# Altium footprint library mastermind.PCBLIB: 1061 footprints (part 47 of 67)
Each footprint in its own frame and in the unit in brackets; x right, y up, seen from the top. Pads: shape width x height; smd on the part's side, far side on the other; paste and mask are expansions set on the pad; w line width, h text height; cw(c..) or ccw(c..) is an arc to the next point about the centre after c.
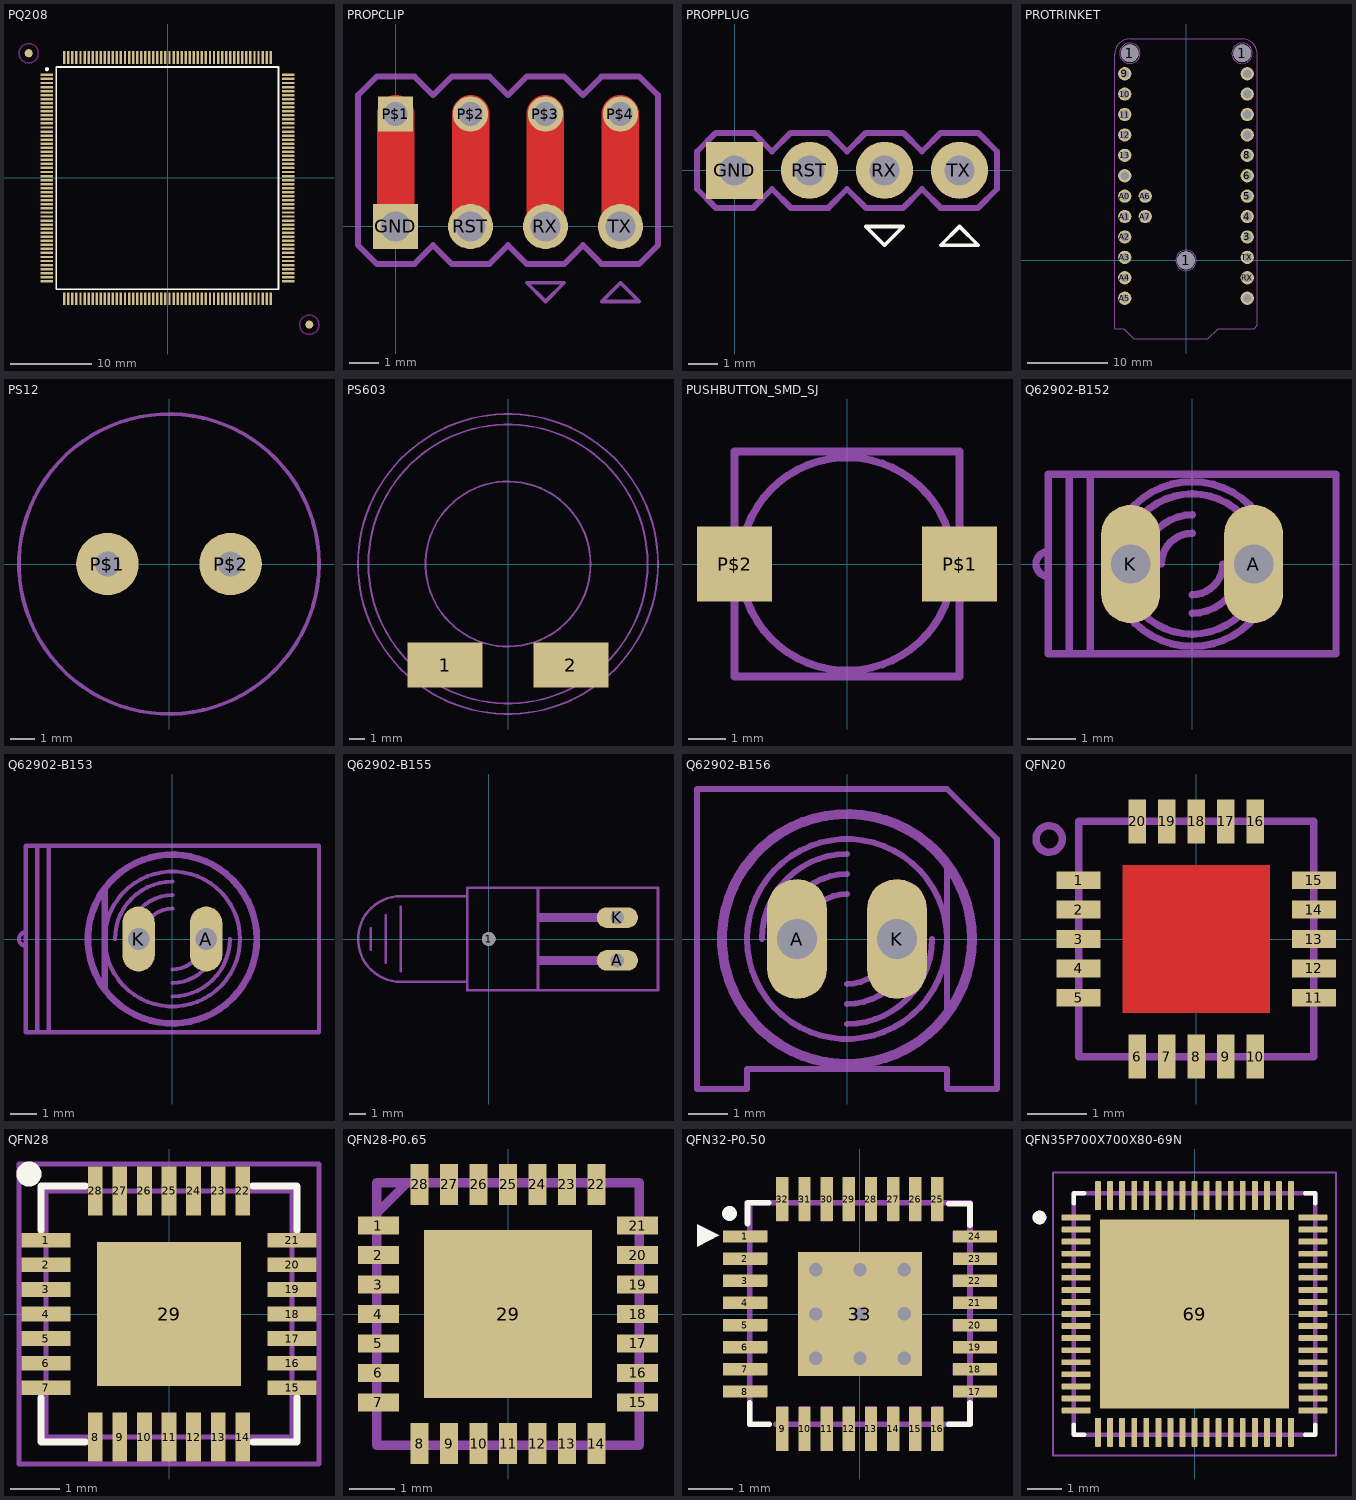
[diagram p46: the footprints below, top view; thin cyan lines are the x and y axes]

## PQ208 [mm]
pads (210):
  rect 1.55x0.3 smd: 1(-14.902,12.738) 2(-14.902,12.238) 3(-14.902,11.738) 4(-14.902,11.238) 5(-14.902,10.738) 6(-14.902,10.238) 7(-14.902,9.738) 8(-14.902,9.238) 9(-14.902,8.738) 10(-14.902,8.238) 11(-14.902,7.738) 12(-14.902,7.238) 13(-14.902,6.738) 14(-14.902,6.238) 15(-14.902,5.738) 16(-14.902,5.238) 17(-14.902,4.738) 18(-14.902,4.238) 19(-14.902,3.738) 20(-14.902,3.238) 21(-14.902,2.738) 22(-14.902,2.238) 23(-14.902,1.738) 24(-14.902,1.238) 25(-14.902,0.738) 26(-14.902,0.238) 27(-14.902,-0.262) 28(-14.902,-0.762) 29(-14.902,-1.262) 30(-14.902,-1.762) 31(-14.902,-2.262) 32(-14.902,-2.762) 33(-14.902,-3.262) 34(-14.902,-3.762) 35(-14.902,-4.262) 36(-14.902,-4.762) 37(-14.902,-5.262) 38(-14.902,-5.762) 39(-14.902,-6.262) 40(-14.902,-6.762) 41(-14.902,-7.262) 42(-14.902,-7.762) 43(-14.902,-8.262) 44(-14.902,-8.762) 45(-14.902,-9.262) 46(-14.902,-9.762) 47(-14.902,-10.262) 48(-14.902,-10.762) 49(-14.902,-11.262) 50(-14.902,-11.762) 51(-14.902,-12.262) 52(-14.902,-12.762) 105(14.898,-12.762) 106(14.898,-12.262) 107(14.898,-11.762) 108(14.898,-11.262) 109(14.898,-10.762) 110(14.898,-10.262) 111(14.898,-9.762) 112(14.898,-9.262) 113(14.898,-8.762) 114(14.898,-8.262) 115(14.898,-7.762) 116(14.898,-7.262) 117(14.898,-6.762) 118(14.898,-6.262) 119(14.898,-5.762) 120(14.898,-5.262) 121(14.898,-4.762) 122(14.898,-4.262) 123(14.898,-3.762) 124(14.898,-3.262) 125(14.898,-2.762) 126(14.898,-2.262) 127(14.898,-1.762) 128(14.898,-1.262) 129(14.898,-0.762) 130(14.898,-0.262) 131(14.898,0.238) 132(14.898,0.738) 133(14.898,1.238) 134(14.898,1.738) 135(14.898,2.238) 136(14.898,2.738) 137(14.898,3.238) 138(14.898,3.738) 139(14.898,4.238) 140(14.898,4.738) 141(14.898,5.238) 142(14.898,5.738) 143(14.898,6.238) 144(14.898,6.738) 145(14.898,7.238) 146(14.898,7.738) 147(14.898,8.238) 148(14.898,8.738) 149(14.898,9.238) 150(14.898,9.738) 151(14.898,10.238) 152(14.898,10.738) 153(14.898,11.238) 154(14.898,11.738) 155(14.898,12.238) 156(14.898,12.738)
  rect 0.3x1.55 smd: 53(-12.752,-14.912) 54(-12.252,-14.912) 55(-11.752,-14.912) 56(-11.252,-14.912) 57(-10.752,-14.912) 58(-10.252,-14.912) 59(-9.752,-14.912) 60(-9.252,-14.912) 61(-8.752,-14.912) 62(-8.252,-14.912) 63(-7.752,-14.912) 64(-7.252,-14.912) 65(-6.752,-14.912) 66(-6.252,-14.912) 67(-5.752,-14.912) 68(-5.252,-14.912) 69(-4.752,-14.912) 70(-4.252,-14.912) 71(-3.752,-14.912) 72(-3.252,-14.912) 73(-2.752,-14.912) 74(-2.252,-14.912) 75(-1.752,-14.912) 76(-1.252,-14.912) 77(-0.752,-14.912) 78(-0.252,-14.912) 79(0.248,-14.912) 80(0.748,-14.912) 81(1.248,-14.912) 82(1.748,-14.912) 83(2.248,-14.912) 84(2.748,-14.912) 85(3.248,-14.912) 86(3.748,-14.912) 87(4.248,-14.912) 88(4.748,-14.912) 89(5.248,-14.912) 90(5.748,-14.912) 91(6.248,-14.912) 92(6.748,-14.912) 93(7.248,-14.912) 94(7.748,-14.912) 95(8.248,-14.912) 96(8.748,-14.912) 97(9.248,-14.912) 98(9.748,-14.912) 99(10.248,-14.912) 100(10.748,-14.912) 101(11.248,-14.912) 102(11.748,-14.912) 103(12.248,-14.912) 104(12.748,-14.912) 157(12.748,14.888) 158(12.248,14.888) 159(11.748,14.888) 160(11.248,14.888) 161(10.748,14.888) 162(10.248,14.888) 163(9.748,14.888) 164(9.248,14.888) 165(8.748,14.888) 166(8.248,14.888) 167(7.748,14.888) 168(7.248,14.888) 169(6.748,14.888) 170(6.248,14.888) 171(5.748,14.888) 172(5.248,14.888) 173(4.748,14.888) 174(4.248,14.888) 175(3.748,14.888) 176(3.248,14.888) 177(2.748,14.888) 178(2.248,14.888) 179(1.748,14.888) 180(1.248,14.888) 181(0.748,14.888) 182(0.248,14.888) 183(-0.252,14.888) 184(-0.752,14.888) 185(-1.252,14.888) 186(-1.752,14.888) 187(-2.252,14.888) 188(-2.752,14.888) 189(-3.252,14.888) 190(-3.752,14.888) 191(-4.252,14.888) 192(-4.752,14.888) 193(-5.252,14.888) 194(-5.752,14.888) 195(-6.252,14.888) 196(-6.752,14.888) 197(-7.252,14.888) 198(-7.752,14.888) 199(-8.252,14.888) 200(-8.752,14.888) 201(-9.252,14.888) 202(-9.752,14.888) 203(-10.252,14.888) 204(-10.752,14.888) 205(-11.252,14.888) 206(-11.752,14.888) 207(-12.252,14.888) 208(-12.752,14.888)
  round 1 smd: FID1(-17.152,15.413) FID2(17.523,-18.112)
Top Layer keep-out:
  circle w0.2: c17.523,-18.137 r1.2
  circle w0.2: c-17.152,15.413 r1.2
Top Overlay:
  circle w0.25: c-14.902,13.438 r0.125
  lines w0.2: -13.727,-13.737 13.723,-13.737 13.723,13.713 -13.727,13.713 -13.727,-13.737
3D body: height 2.5, standoff 0, extent -13.716,-13.716 13.716,13.716
3D body: height 1, standoff 0, extent -15.35,12.62 -13.65,12.85
3D body: height 1, standoff 0, extent -15.35,12.12 -13.65,12.35
3D body: height 1, standoff 0, extent -15.35,11.62 -13.65,11.85
3D body: height 1, standoff 0, extent -15.35,11.12 -13.65,11.35
3D body: height 1, standoff 0, extent -15.35,10.62 -13.65,10.85
3D body: height 1, standoff 0, extent -15.35,10.12 -13.65,10.35
3D body: height 1, standoff 0, extent -15.35,9.62 -13.65,9.85
3D body: height 1, standoff 0, extent -15.35,9.12 -13.65,9.35
3D body: height 1, standoff 0, extent -15.35,8.62 -13.65,8.85
3D body: height 1, standoff 0, extent -15.35,8.12 -13.65,8.35
3D body: height 1, standoff 0, extent -15.35,7.62 -13.65,7.85
3D body: height 1, standoff 0, extent -15.35,7.12 -13.65,7.35
3D body: height 1, standoff 0, extent -15.35,6.62 -13.65,6.85
3D body: height 1, standoff 0, extent -15.35,6.12 -13.65,6.35
3D body: height 1, standoff 0, extent -15.35,5.62 -13.65,5.85
3D body: height 1, standoff 0, extent -15.35,5.12 -13.65,5.35
3D body: height 1, standoff 0, extent -15.35,4.62 -13.65,4.85
3D body: height 1, standoff 0, extent -15.35,4.12 -13.65,4.35
3D body: height 1, standoff 0, extent -15.35,3.62 -13.65,3.85
3D body: height 1, standoff 0, extent -15.35,3.12 -13.65,3.35
3D body: height 1, standoff 0, extent -15.35,2.62 -13.65,2.85
3D body: height 1, standoff 0, extent -15.35,2.12 -13.65,2.35
3D body: height 1, standoff 0, extent -15.35,1.62 -13.65,1.85
3D body: height 1, standoff 0, extent -15.35,1.12 -13.65,1.35
3D body: height 1, standoff 0, extent -15.35,0.62 -13.65,0.85
3D body: height 1, standoff 0, extent -15.35,0.12 -13.65,0.35
3D body: height 1, standoff 0, extent -15.35,-0.38 -13.65,-0.15
3D body: height 1, standoff 0, extent -15.35,-0.88 -13.65,-0.65
3D body: height 1, standoff 0, extent -15.35,-1.38 -13.65,-1.15
3D body: height 1, standoff 0, extent -15.35,-1.88 -13.65,-1.65
3D body: height 1, standoff 0, extent -15.35,-2.38 -13.65,-2.15
3D body: height 1, standoff 0, extent -15.35,-2.88 -13.65,-2.65
3D body: height 1, standoff 0, extent -15.35,-3.38 -13.65,-3.15
3D body: height 1, standoff 0, extent -15.35,-3.88 -13.65,-3.65
3D body: height 1, standoff 0, extent -15.35,-4.38 -13.65,-4.15
3D body: height 1, standoff 0, extent -15.35,-4.88 -13.65,-4.65
3D body: height 1, standoff 0, extent -15.35,-5.38 -13.65,-5.15
3D body: height 1, standoff 0, extent -15.35,-5.88 -13.65,-5.65
3D body: height 1, standoff 0, extent -15.35,-6.38 -13.65,-6.15
3D body: height 1, standoff 0, extent -15.35,-6.88 -13.65,-6.65
3D body: height 1, standoff 0, extent -15.35,-7.38 -13.65,-7.15
3D body: height 1, standoff 0, extent -15.35,-7.88 -13.65,-7.65
3D body: height 1, standoff 0, extent -15.35,-8.38 -13.65,-8.15
3D body: height 1, standoff 0, extent -15.35,-8.88 -13.65,-8.65
3D body: height 1, standoff 0, extent -15.35,-9.38 -13.65,-9.15
3D body: height 1, standoff 0, extent -15.35,-9.88 -13.65,-9.65
3D body: height 1, standoff 0, extent -15.35,-10.38 -13.65,-10.15
3D body: height 1, standoff 0, extent -15.35,-10.88 -13.65,-10.65
3D body: height 1, standoff 0, extent -15.35,-11.38 -13.65,-11.15
3D body: height 1, standoff 0, extent -15.35,-11.88 -13.65,-11.65
3D body: height 1, standoff 0, extent -15.35,-12.38 -13.65,-12.15
3D body: height 1, standoff 0, extent -15.35,-12.88 -13.65,-12.65
3D body: height 1, standoff 0, extent 13.646,-12.874 15.346,-12.644
3D body: height 1, standoff 0, extent 13.646,-12.374 15.346,-12.144
3D body: height 1, standoff 0, extent 13.646,-11.874 15.346,-11.644
3D body: height 1, standoff 0, extent 13.646,-11.374 15.346,-11.144
3D body: height 1, standoff 0, extent 13.646,-10.874 15.346,-10.644
3D body: height 1, standoff 0, extent 13.646,-10.374 15.346,-10.144
3D body: height 1, standoff 0, extent 13.646,-9.874 15.346,-9.644
3D body: height 1, standoff 0, extent 13.646,-9.374 15.346,-9.144
3D body: height 1, standoff 0, extent 13.646,-8.874 15.346,-8.644
3D body: height 1, standoff 0, extent 13.646,-8.374 15.346,-8.144
3D body: height 1, standoff 0, extent 13.646,-7.874 15.346,-7.644
3D body: height 1, standoff 0, extent 13.646,-7.374 15.346,-7.144
3D body: height 1, standoff 0, extent 13.646,-6.874 15.346,-6.644
3D body: height 1, standoff 0, extent 13.646,-6.374 15.346,-6.144
3D body: height 1, standoff 0, extent 13.646,-5.874 15.346,-5.644
3D body: height 1, standoff 0, extent 13.646,-5.374 15.346,-5.144
3D body: height 1, standoff 0, extent 13.646,-4.874 15.346,-4.644
3D body: height 1, standoff 0, extent 13.646,-4.374 15.346,-4.144
3D body: height 1, standoff 0, extent 13.646,-3.874 15.346,-3.644
3D body: height 1, standoff 0, extent 13.646,-3.374 15.346,-3.144
3D body: height 1, standoff 0, extent 13.646,-2.874 15.346,-2.644
3D body: height 1, standoff 0, extent 13.646,-2.374 15.346,-2.144
3D body: height 1, standoff 0, extent 13.646,-1.874 15.346,-1.644
3D body: height 1, standoff 0, extent 13.646,-1.374 15.346,-1.144
3D body: height 1, standoff 0, extent 13.646,-0.874 15.346,-0.644
3D body: height 1, standoff 0, extent 13.646,-0.374 15.346,-0.144
3D body: height 1, standoff 0, extent 13.646,0.126 15.346,0.356
3D body: height 1, standoff 0, extent 13.646,0.626 15.346,0.856
3D body: height 1, standoff 0, extent 13.646,1.126 15.346,1.356
3D body: height 1, standoff 0, extent 13.646,1.626 15.346,1.856
3D body: height 1, standoff 0, extent 13.646,2.126 15.346,2.356
3D body: height 1, standoff 0, extent 13.646,2.626 15.346,2.856
3D body: height 1, standoff 0, extent 13.646,3.126 15.346,3.356
3D body: height 1, standoff 0, extent 13.646,3.626 15.346,3.856
3D body: height 1, standoff 0, extent 13.646,4.126 15.346,4.356
3D body: height 1, standoff 0, extent 13.646,4.626 15.346,4.856
3D body: height 1, standoff 0, extent 13.646,5.126 15.346,5.356
3D body: height 1, standoff 0, extent 13.646,5.626 15.346,5.856
3D body: height 1, standoff 0, extent 13.646,6.126 15.346,6.356
3D body: height 1, standoff 0, extent 13.646,6.626 15.346,6.856
3D body: height 1, standoff 0, extent 13.646,7.126 15.346,7.356
3D body: height 1, standoff 0, extent 13.646,7.626 15.346,7.856
3D body: height 1, standoff 0, extent 13.646,8.126 15.346,8.356
3D body: height 1, standoff 0, extent 13.646,8.626 15.346,8.856
3D body: height 1, standoff 0, extent 13.646,9.126 15.346,9.356
3D body: height 1, standoff 0, extent 13.646,9.626 15.346,9.856
3D body: height 1, standoff 0, extent 13.646,10.126 15.346,10.356
3D body: height 1, standoff 0, extent 13.646,10.626 15.346,10.856
3D body: height 1, standoff 0, extent 13.646,11.126 15.346,11.356
3D body: height 1, standoff 0, extent 13.646,11.626 15.346,11.856
3D body: height 1, standoff 0, extent 13.646,12.126 15.346,12.356
3D body: height 1, standoff 0, extent 13.646,12.626 15.346,12.856
3D body: height 1, standoff 0, extent -12.87,13.636 -12.64,15.336
3D body: height 1, standoff 0, extent -12.37,13.636 -12.14,15.336
3D body: height 1, standoff 0, extent -11.87,13.636 -11.64,15.336
3D body: height 1, standoff 0, extent -11.37,13.636 -11.14,15.336
3D body: height 1, standoff 0, extent -10.87,13.636 -10.64,15.336
3D body: height 1, standoff 0, extent -10.37,13.636 -10.14,15.336
3D body: height 1, standoff 0, extent -9.87,13.636 -9.64,15.336
3D body: height 1, standoff 0, extent -9.37,13.636 -9.14,15.336
3D body: height 1, standoff 0, extent -8.87,13.636 -8.64,15.336
3D body: height 1, standoff 0, extent -8.37,13.636 -8.14,15.336
3D body: height 1, standoff 0, extent -7.87,13.636 -7.64,15.336
3D body: height 1, standoff 0, extent -7.37,13.636 -7.14,15.336
3D body: height 1, standoff 0, extent -6.87,13.636 -6.64,15.336
3D body: height 1, standoff 0, extent -6.37,13.636 -6.14,15.336
3D body: height 1, standoff 0, extent -5.87,13.636 -5.64,15.336
3D body: height 1, standoff 0, extent -5.37,13.636 -5.14,15.336
3D body: height 1, standoff 0, extent -4.87,13.636 -4.64,15.336
3D body: height 1, standoff 0, extent -4.37,13.636 -4.14,15.336
3D body: height 1, standoff 0, extent -3.87,13.636 -3.64,15.336
3D body: height 1, standoff 0, extent -3.37,13.636 -3.14,15.336
3D body: height 1, standoff 0, extent -2.87,13.636 -2.64,15.336
3D body: height 1, standoff 0, extent -2.37,13.636 -2.14,15.336
3D body: height 1, standoff 0, extent -1.87,13.636 -1.64,15.336
3D body: height 1, standoff 0, extent -1.37,13.636 -1.14,15.336
3D body: height 1, standoff 0, extent -0.87,13.636 -0.64,15.336
3D body: height 1, standoff 0, extent -0.37,13.636 -0.14,15.336
3D body: height 1, standoff 0, extent 0.13,13.636 0.36,15.336
3D body: height 1, standoff 0, extent 0.63,13.636 0.86,15.336
3D body: height 1, standoff 0, extent 1.13,13.636 1.36,15.336
3D body: height 1, standoff 0, extent 1.63,13.636 1.86,15.336
3D body: height 1, standoff 0, extent 2.13,13.636 2.36,15.336
3D body: height 1, standoff 0, extent 2.63,13.636 2.86,15.336
3D body: height 1, standoff 0, extent 3.13,13.636 3.36,15.336
3D body: height 1, standoff 0, extent 3.63,13.636 3.86,15.336
3D body: height 1, standoff 0, extent 4.13,13.636 4.36,15.336
3D body: height 1, standoff 0, extent 4.63,13.636 4.86,15.336
3D body: height 1, standoff 0, extent 5.13,13.636 5.36,15.336
3D body: height 1, standoff 0, extent 5.63,13.636 5.86,15.336
3D body: height 1, standoff 0, extent 6.13,13.636 6.36,15.336
3D body: height 1, standoff 0, extent 6.63,13.636 6.86,15.336
3D body: height 1, standoff 0, extent 7.13,13.636 7.36,15.336
3D body: height 1, standoff 0, extent 7.63,13.636 7.86,15.336
3D body: height 1, standoff 0, extent 8.13,13.636 8.36,15.336
3D body: height 1, standoff 0, extent 8.63,13.636 8.86,15.336
3D body: height 1, standoff 0, extent 9.13,13.636 9.36,15.336
3D body: height 1, standoff 0, extent 9.63,13.636 9.86,15.336
3D body: height 1, standoff 0, extent 10.13,13.636 10.36,15.336
3D body: height 1, standoff 0, extent 10.63,13.636 10.86,15.336
3D body: height 1, standoff 0, extent 11.13,13.636 11.36,15.336
3D body: height 1, standoff 0, extent 11.63,13.636 11.86,15.336
3D body: height 1, standoff 0, extent 12.13,13.636 12.36,15.336
3D body: height 1, standoff 0, extent 12.63,13.636 12.86,15.336
3D body: height 1, standoff 0, extent -12.864,-15.36 -12.634,-13.66
3D body: height 1, standoff 0, extent -12.364,-15.36 -12.134,-13.66
3D body: height 1, standoff 0, extent -11.864,-15.36 -11.634,-13.66
3D body: height 1, standoff 0, extent -11.364,-15.36 -11.134,-13.66
3D body: height 1, standoff 0, extent -10.864,-15.36 -10.634,-13.66
3D body: height 1, standoff 0, extent -10.364,-15.36 -10.134,-13.66
3D body: height 1, standoff 0, extent -9.864,-15.36 -9.634,-13.66
3D body: height 1, standoff 0, extent -9.364,-15.36 -9.134,-13.66
3D body: height 1, standoff 0, extent -8.864,-15.36 -8.634,-13.66
3D body: height 1, standoff 0, extent -8.364,-15.36 -8.134,-13.66
3D body: height 1, standoff 0, extent -7.864,-15.36 -7.634,-13.66
3D body: height 1, standoff 0, extent -7.364,-15.36 -7.134,-13.66
3D body: height 1, standoff 0, extent -6.864,-15.36 -6.634,-13.66
3D body: height 1, standoff 0, extent -6.364,-15.36 -6.134,-13.66
3D body: height 1, standoff 0, extent -5.864,-15.36 -5.634,-13.66
3D body: height 1, standoff 0, extent -5.364,-15.36 -5.134,-13.66
3D body: height 1, standoff 0, extent -4.864,-15.36 -4.634,-13.66
3D body: height 1, standoff 0, extent -4.364,-15.36 -4.134,-13.66
3D body: height 1, standoff 0, extent -3.864,-15.36 -3.634,-13.66
3D body: height 1, standoff 0, extent -3.364,-15.36 -3.134,-13.66
3D body: height 1, standoff 0, extent -2.864,-15.36 -2.634,-13.66
3D body: height 1, standoff 0, extent -2.364,-15.36 -2.134,-13.66
3D body: height 1, standoff 0, extent -1.864,-15.36 -1.634,-13.66
3D body: height 1, standoff 0, extent -1.364,-15.36 -1.134,-13.66
3D body: height 1, standoff 0, extent -0.864,-15.36 -0.634,-13.66
3D body: height 1, standoff 0, extent -0.364,-15.36 -0.134,-13.66
3D body: height 1, standoff 0, extent 0.136,-15.36 0.366,-13.66
3D body: height 1, standoff 0, extent 0.636,-15.36 0.866,-13.66
3D body: height 1, standoff 0, extent 1.136,-15.36 1.366,-13.66
3D body: height 1, standoff 0, extent 1.636,-15.36 1.866,-13.66
3D body: height 1, standoff 0, extent 2.136,-15.36 2.366,-13.66
3D body: height 1, standoff 0, extent 2.636,-15.36 2.866,-13.66
3D body: height 1, standoff 0, extent 3.136,-15.36 3.366,-13.66
3D body: height 1, standoff 0, extent 3.636,-15.36 3.866,-13.66
3D body: height 1, standoff 0, extent 4.136,-15.36 4.366,-13.66
3D body: height 1, standoff 0, extent 4.636,-15.36 4.866,-13.66
3D body: height 1, standoff 0, extent 5.136,-15.36 5.366,-13.66
3D body: height 1, standoff 0, extent 5.636,-15.36 5.866,-13.66
3D body: height 1, standoff 0, extent 6.136,-15.36 6.366,-13.66
3D body: height 1, standoff 0, extent 6.636,-15.36 6.866,-13.66
3D body: height 1, standoff 0, extent 7.136,-15.36 7.366,-13.66
3D body: height 1, standoff 0, extent 7.636,-15.36 7.866,-13.66
3D body: height 1, standoff 0, extent 8.136,-15.36 8.366,-13.66
3D body: height 1, standoff 0, extent 8.636,-15.36 8.866,-13.66
3D body: height 1, standoff 0, extent 9.136,-15.36 9.366,-13.66
3D body: height 1, standoff 0, extent 9.636,-15.36 9.866,-13.66
3D body: height 1, standoff 0, extent 10.136,-15.36 10.366,-13.66
3D body: height 1, standoff 0, extent 10.636,-15.36 10.866,-13.66
3D body: height 1, standoff 0, extent 11.136,-15.36 11.366,-13.66
3D body: height 1, standoff 0, extent 11.636,-15.36 11.866,-13.66
3D body: height 1, standoff 0, extent 12.136,-15.36 12.366,-13.66
3D body: height 1, standoff 0, extent 12.636,-15.36 12.866,-13.66

## PROPCLIP [mil]
pads (8):
  rect 60x60 hole 40: GND(0,0)
  rect 47.25x47.25 hole 31.5: P$1(0,150)
  round 47.25 hole 31.5: P$2(100,150) P$3(200,150) P$4(300,150)
  round 60 hole 40: RST(100,0) RX(200,0) TX(300,0)
Top Layer:
  lines w50: 0,0 0,150 ; 100,0 100,150 ; 200,0 200,150 ; 300,0 300,150
Mechanical 2:
  lines w5: 175,-75 225,-75 200,-100 175,-75 ; 275,-100 300,-75 325,-100 275,-100
  lines w8: -50,-25 -25,-50 25,-50 50,-25 75,-50 125,-50 150,-25 175,-50 225,-50 250,-25 275,-50 325,-50 350,-25 350,175 325,200 275,200 250,175 225,200 175,200 150,175 125,200 75,200 50,175 25,200 -25,200 -50,175 -50,-25
Mechanical 8:
  region: -10,-10 -10,10 10,10 10,-10
  region: 90,-10 90,10 110,10 110,-10
  region: 190,-10 190,10 210,10 210,-10
  region: 290,-10 290,10 310,10 310,-10

## PROPPLUG [mil]
pads (4):
  rect 76x76 hole 40: GND(0,0)
  round 76 hole 40: RST(100,0) RX(200,0) TX(300,0)
Top Overlay:
  lines w5: 175,-75 225,-75 200,-100 175,-75 ; 275,-100 300,-75 325,-100 275,-100
Mechanical 2:
  lines w8: -50,-25 -25,-50 25,-50 50,-25 75,-50 125,-50 150,-25 175,-50 225,-50 250,-25 275,-50 325,-50 350,-25 350,25 325,50 275,50 250,25 225,50 175,50 150,25 125,50 75,50 50,25 25,50 -25,50 -50,25 -50,-25
Mechanical 8:
  region: -10,-10 -10,10 10,10 10,-10
  region: 90,-10 90,10 110,10 110,-10
  region: 190,-10 190,10 210,10 210,-10
  region: 290,-10 290,10 310,10 310,-10

## PROTRINKET [mil]
pads (29):
  round 86.61 hole 86.61: 1(-275,1015) 1(0,0) 1(275,1015)
  round 64.97 hole 43.31: 3(300,115) 4(300,215) 5(300,315) 6(300,415) 8(300,515) 9(-300,915) 10(-300,815) 11(-300,715) 12(-300,615) 13(-300,515) A0(-300,315) A1(-300,215) A2(-300,115) A3(-300,15) A4(-300,-85) A5(-300,-185) A6(-200,315) A7(-200,215) AREF(-300,415) BAT+(300,915) GND(300,815) RST(300,-185) RX(300,-85) TX(300,15) USB(300,715) VCC(300,615)
Mechanical 2:
  lines w0: -350,-335 -305,-335 -255,-385 107.5,-385 157.5,-335 335,-335 350,-317.5 350,1010 ccw(c275,1010) 275,1085 -275,1085 ccw(c-275,1010) -350,1010 -350,-335
Mechanical 8:
  circle w5: c0,0 r50
  circle w5: c-275,1015 r50
  circle w5: c275,1015 r50.25

## PS12 [mm]
pads (2):
  round 2.54 hole 1: P$1(-2.5,0) P$2(2.5,0)
Mechanical 2:
  circle w0.152: c0,0 r6.096

## PS603 [mm]
pads (2):
  rect 5x3 smd: 1(-4.184,-6.738) 2(4.184,-6.738)
Mechanical 2:
  circle w0.127: c0,0 r5.5
  circle w0.127: c0,0 r9.302
  circle w0.127: c0,0 r10

## PUSHBUTTON_SMD_SJ [mm]
pads (2):
  rect 2x2 smd: P$1(3,0) P$2(-3,0)
Mechanical 2:
  lines w0.203: -3,-1.7 -3,-3 3,-3 3,-1.7 ; -3,1.7 -3,3 3,3 3,1.7
Mechanical 8:
  circle w0.203: c0,0 r2.84
  lines w0.127: -3,-3 3,-3 ; -3,3 3,3
  lines w0.203: -3,-3 -3,3 ; 3,-3 3,3

## Q62902-B152 [mil]
pads (2):
  oval 48x96 hole 32: A(50,0) K(-50,0)
Mechanical 2:
  lines w6: -117,-10 cw(c-117,0) -117,10 ; -57.55,34.31 cw(c0,0) 0,67 cw(c0,0) 57.77,33.93 ; -57.37,-34.62 ccw(c-0.01,0) 0,-67 ccw(c0.01,0) 57.37,-34.62 ; -45.22,34.7 cw(c0,0) 0,57 cw(c0,0) 45.18,34.75 ; -44.69,-35.38 ccw(c0,0) 0,-57 ccw(c0,0) 44.51,-35.61 ; -25,0 cw(c0,0) 0,25 ; -100,-73 -117,-73 -117,73 -100,73 ; -100,-73 -100,73 ; -100,-73 -83,-73 ; -100,73 -83,73 ; -83,-73 -83,-19 -83,19 -83,73 ; -83,-73 117,-73 117,-19 117,19 117,73 -83,73
Mechanical 8:
  lines w6: -57.09,-35.06 cw(c0,0.01) -67,0 cw(c-0.01,0) -56.88,35.41 ; -45.1,34.85 ccw(c-0.01,0) -57,0 ccw(c0,0) -44.51,-35.61 ; -40,0 cw(c0,0) 0,40 ; 0,-40 ccw(c0,0) 40,0 ; 0,-25 ccw(c0,0) 25,0 ; 44.41,-35.72 ccw(c0,0.01) 57,0 ccw(c0,0) 44.89,35.13 ; 56.93,-35.33 ccw(c0.01,-0.01) 67,0 ccw(c-0.01,0) 57.17,34.94

## Q62902-B153 [mil]
pads (2):
  oval 48x96 hole 32: A(50,0) K(-50,0)
Mechanical 2:
  circle w6: c0,0 r100
  circle w10: c0,0 r125
  lines w6: -217,-10 cw(c-217,0) -217,10 ; -200,-138 -183,-138 ; -200,-138 -200,138 ; -200,-138 -217,-138 -217,138 -200,138 ; -200,138 -183,138 ; -183,-138 217,-138 217,138 -183,138 ; -183,-138 -183,138
  lines w10: -100,-75 -100,75
Mechanical 8:
  lines w6: -85,0 cw(c0,0) 0,85 ; -65,0 cw(c0,0) 0,65 ; -45,0 cw(c0,0) 0,45 ; 0,-85 ccw(c0,0) 85,0 ; 0,-65 ccw(c0,0) 65,0 ; 0,-45 ccw(c0,0) 45,0

## Q62902-B155 [mil]
pads (3):
  round 32 hole 32: 1(0,0)
  oval 96x48 hole 32: A(300,-50) K(300,50)
Mechanical 2:
  region: 115,40 115,60 265,60 265,40
  region: 115,-60 115,-40 265,-40 265,-60
  lines w6: -275,-25 -275,25 ; -240,-55 -240,55 ; -205,-75 -205,75 ; -50,-100 -50,-120 115,-120 ; -50,-100 -205,-100 cw(c-205,0) -205,100 -50,100 ; -50,-100 -50,100 ; -50,100 -50,120 115,120 ; 115,-120 115,120 ; 115,-120 395,-120 395,120 115,120

## Q62902-B156 [mil]
pads (2):
  oval 60x120 hole 40: A(-50,0) K(50,0)
Mechanical 2:
  circle w10: c0,0 r125
  circle w6: c0,0 r100
  lines w6: 100,-75 100,75 ; -150,-150 -100,-150 -100,-130 100,-130 100,-150 150,-150 150,100 100,150 -150,150 -150,-150
Mechanical 8:
  lines w6: -85,0 cw(c0,0) 0,85 ; -65,0 cw(c0,0) 0,65 ; -45,0 cw(c0,0) 0,45 ; 0,-85 ccw(c0,0) 85,0 ; 0,-65 ccw(c0,0) 65,0 ; 0,-45 ccw(c0,0) 45,0

## QFN20 [mm]
pads (20):
  rect 0.75x0.3 smd: 1(-2,1) 2(-2,0.5) 3(-2,0) 4(-2,-0.5) 5(-2,-1) 11(2,-1) 12(2,-0.5) 13(2,0) 14(2,0.5) 15(2,1)
  rect 0.3x0.75 smd: 6(-1,-2) 7(-0.5,-2) 8(0,-2) 9(0.5,-2) 10(1,-2) 16(1,2) 17(0.5,2) 18(0,2) 19(-0.5,2) 20(-1,2)
Top Layer:
  region: -1.25,-1.25 -1.25,1.25 1.25,1.25 1.25,-1.25
Top Paste:
  region: -1.2,-1.2 -1.2,-0.4 -0.4,-0.4 -0.4,-1.2
  region: 0.4,-1.2 0.4,-0.4 1.2,-0.4 1.2,-1.2
  region: 0.4,0.4 0.4,1.2 1.2,1.2 1.2,0.4
  region: -1.2,0.4 -1.2,1.2 -0.4,1.2 -0.4,0.4
Top Solder:
  region: -1.3,-1.3 -1.3,1.3 1.3,1.3 1.3,-1.3
Mechanical 2:
  circle w0.127: c-2.5,1.7 r0.224
  lines w0.127: -2,-2 -2,2 2,2 2,-2 -2,-2

## QFN28 [mm]
pads (29):
  rect 1x0.3 smd: 1(-2.5,1.5) 2(-2.5,1) 3(-2.5,0.5) 4(-2.5,0) 5(-2.5,-0.5) 6(-2.5,-1) 7(-2.5,-1.5) 15(2.5,-1.5) 16(2.5,-1) 17(2.5,-0.5) 18(2.5,0) 19(2.5,0.5) 20(2.5,1) 21(2.5,1.5)
  rect 0.3x1 smd: 8(-1.5,-2.5) 9(-1,-2.5) 10(-0.5,-2.5) 11(0,-2.5) 12(0.5,-2.5) 13(1,-2.5) 14(1.5,-2.5) 22(1.5,2.5) 23(1,2.5) 24(0.5,2.5) 25(0,2.5) 26(-0.5,2.5) 27(-1,2.5) 28(-1.5,2.5)
  rect 2.921x2.921 smd paste-3.2: 29(0,0)
Top Overlay:
  circle w0.254: c-2.844,2.844 r0.127
  lines w0.15: -2.6,-1.7 -2.6,-2.6 -1.7,-2.6 ; -2.6,1.7 -2.6,2.6 ; -2.591,2.6 -1.7,2.6 ; 1.7,-2.6 2.6,-2.6 2.6,-1.7 ; 1.7,2.6 2.6,2.6 2.6,1.7
Top Paste:
  region: 1.524,-0.381 1.524,0.381 0.762,0.381 0.762,-0.381
  region: -0.762,-0.381 -0.762,0.381 -1.524,0.381 -1.524,-0.381
  region: 0.381,-0.381 0.381,0.381 -0.381,0.381 -0.381,-0.381
  region: 1.524,-1.524 1.524,-0.762 0.762,-0.762 0.762,-1.524
  region: 0.381,-1.524 0.381,-0.762 -0.381,-0.762 -0.381,-1.524
  region: -1.524,-1.524 -0.762,-1.524 -0.762,-0.762 -1.524,-0.762
  region: -1.524,0.762 -0.762,0.762 -0.762,1.524 -1.524,1.524
  region: -0.381,1.524 -0.381,0.762 0.381,0.762 0.381,1.524
  region: 0.762,1.524 0.762,0.762 1.524,0.762 1.524,1.524
Mechanical 13:
  lines w0.1: -2.5,-2.5 2.5,-2.5 2.5,2.5 -2.5,2.5 -2.5,-2.5
Mechanical 15:
  lines w0.1: -0.5,0 0.5,0 ; 0,-0.5 0,0.5 ; -3.048,-3.048 3.048,-3.048 3.048,3.048 -3.048,3.048 -3.048,-3.048
3D body "User Library-QFN-28-0_5.STEP": height 1, standoff 0, extent -2.5,-2.5 2.5,2.5

## QFN28-P0.65 [mm]
pads (29):
  rect 0.9x0.4 smd paste-0.35 mask-0.35: 1(-2.86,1.95) 2(-2.86,1.3) 3(-2.86,0.65) 4(-2.86,0) 5(-2.86,-0.65) 6(-2.86,-1.3) 7(-2.86,-1.95) 15(2.86,-1.95) 16(2.86,-1.3) 17(2.86,-0.65) 18(2.86,0) 19(2.86,0.65) 20(2.86,1.3) 21(2.86,1.95)
  rect 0.4x0.9 smd paste-0.35 mask-0.35: 8(-1.95,-2.86) 9(-1.3,-2.86) 10(-0.65,-2.86) 11(0,-2.86) 12(0.65,-2.86) 13(1.3,-2.86) 14(1.95,-2.86) 22(1.95,2.86) 23(1.3,2.86) 24(0.65,2.86) 25(0,2.86) 26(-0.65,2.86) 27(-1.3,2.86) 28(-1.95,2.86)
  rect 3.7x3.7 smd paste-1.85 mask-1.85: 29(0,0)
Top Paste:
  region: -3.042,1.787 -3.042,2.113 -2.359,2.113 -2.359,1.787
  region: -3.042,1.137 -3.042,1.463 -2.359,1.463 -2.359,1.137
  region: -3.042,0.487 -3.042,0.813 -2.359,0.813 -2.359,0.487
  region: -3.042,-0.163 -3.042,0.163 -2.359,0.163 -2.359,-0.163
  region: -3.042,-0.813 -3.042,-0.487 -2.359,-0.487 -2.359,-0.813
  region: -3.042,-1.463 -3.042,-1.137 -2.359,-1.137 -2.359,-1.463
  region: -3.042,-2.113 -3.042,-1.787 -2.359,-1.787 -2.359,-2.113
  region: -1.788,-3.042 -2.112,-3.042 -2.112,-2.36 -1.788,-2.36
  region: -1.138,-3.042 -1.462,-3.042 -1.462,-2.36 -1.138,-2.36
  region: -0.488,-3.042 -0.812,-3.042 -0.812,-2.36 -0.488,-2.36
  region: 0.162,-3.042 -0.162,-3.042 -0.162,-2.36 0.162,-2.36
  region: 0.812,-3.042 0.488,-3.042 0.488,-2.36 0.812,-2.36
  region: 1.462,-3.042 1.138,-3.042 1.138,-2.36 1.462,-2.36
  region: 2.112,-3.042 1.788,-3.042 1.788,-2.36 2.112,-2.36
  region: 3.042,-1.787 3.042,-2.113 2.359,-2.113 2.359,-1.787
  region: 3.042,-1.137 3.042,-1.463 2.359,-1.463 2.359,-1.137
  region: 3.042,-0.487 3.042,-0.813 2.359,-0.813 2.359,-0.487
  region: 3.042,0.163 3.042,-0.163 2.359,-0.163 2.359,0.163
  region: 3.042,0.813 3.042,0.487 2.359,0.487 2.359,0.813
  region: 3.042,1.463 3.042,1.137 2.359,1.137 2.359,1.463
  region: 3.042,2.113 3.042,1.787 2.359,1.787 2.359,2.113
  region: 1.788,3.042 2.112,3.042 2.112,2.36 1.788,2.36
  region: 1.138,3.042 1.462,3.042 1.462,2.36 1.138,2.36
  region: 0.488,3.042 0.812,3.042 0.812,2.36 0.488,2.36
  region: -0.162,3.042 0.162,3.042 0.162,2.36 -0.162,2.36
  region: -0.812,3.042 -0.488,3.042 -0.488,2.36 -0.812,2.36
  region: -1.462,3.042 -1.138,3.042 -1.138,2.36 -1.462,2.36
  region: -2.112,3.042 -1.788,3.042 -1.788,2.36 -2.112,2.36
  region: -1.736,-1.736 -1.736,1.736 1.736,1.736 1.736,-1.736
Top Solder:
  region: -3.055,1.768 -3.055,2.132 -2.346,2.132 -2.346,1.768
  region: -3.055,1.118 -3.055,1.482 -2.346,1.482 -2.346,1.118
  region: -3.055,0.468 -3.055,0.832 -2.346,0.832 -2.346,0.468
  region: -3.055,-0.182 -3.055,0.182 -2.346,0.182 -2.346,-0.182
  region: -3.055,-0.832 -3.055,-0.468 -2.346,-0.468 -2.346,-0.832
  region: -3.055,-1.482 -3.055,-1.118 -2.346,-1.118 -2.346,-1.482
  region: -3.055,-2.132 -3.055,-1.768 -2.346,-1.768 -2.346,-2.132
  region: -1.768,-3.055 -2.132,-3.055 -2.132,-2.346 -1.768,-2.346
  region: -1.118,-3.055 -1.482,-3.055 -1.482,-2.346 -1.118,-2.346
  region: -0.468,-3.055 -0.832,-3.055 -0.832,-2.346 -0.468,-2.346
  region: 0.182,-3.055 -0.182,-3.055 -0.182,-2.347 0.182,-2.347
  region: 0.832,-3.055 0.468,-3.055 0.468,-2.346 0.832,-2.346
  region: 1.482,-3.055 1.118,-3.055 1.118,-2.346 1.482,-2.346
  region: 2.132,-3.055 1.768,-3.055 1.768,-2.346 2.132,-2.346
  region: 3.055,-1.768 3.055,-2.132 2.346,-2.132 2.346,-1.768
  region: 3.055,-1.118 3.055,-1.482 2.346,-1.482 2.346,-1.118
  region: 3.055,-0.468 3.055,-0.832 2.346,-0.832 2.346,-0.468
  region: 3.055,0.182 3.055,-0.182 2.346,-0.182 2.346,0.182
  region: 3.055,0.832 3.055,0.468 2.346,0.468 2.346,0.832
  region: 3.055,1.482 3.055,1.118 2.346,1.118 2.346,1.482
  region: 3.055,2.132 3.055,1.768 2.346,1.768 2.346,2.132
  region: 1.768,3.055 2.132,3.055 2.132,2.346 1.768,2.346
  region: 1.118,3.055 1.482,3.055 1.482,2.346 1.118,2.346
  region: 0.468,3.055 0.832,3.055 0.832,2.346 0.468,2.346
  region: -0.182,3.055 0.182,3.055 0.182,2.347 -0.182,2.347
  region: -0.832,3.055 -0.468,3.055 -0.468,2.346 -0.832,2.346
  region: -1.482,3.055 -1.118,3.055 -1.118,2.346 -1.482,2.346
  region: -2.132,3.055 -1.768,3.055 -1.768,2.346 -2.132,2.346
  region: -1.859,-1.859 -1.859,1.859 1.859,1.859 1.859,-1.859
Mechanical 2:
  lines w0.203: -2.898,2.221 -2.22,2.9 -2.22,2.898 -2.898,2.898 -2.898,2.221
Mechanical 8:
  lines w0.203: -2.898,2.221 -2.898,-2.898 2.898,-2.898 2.898,2.898 -2.22,2.898

## QFN32-P0.50 [mm]
pads (33):
  rect 1x0.28 smd: 1(-2.6,1.753) 2(-2.6,1.252) 3(-2.6,0.751) 4(-2.6,0.25) 5(-2.6,-0.25) 6(-2.6,-0.751) 7(-2.6,-1.252) 8(-2.6,-1.753) 17(2.6,-1.753) 18(2.6,-1.252) 19(2.6,-0.751) 20(2.6,-0.25) 21(2.6,0.25) 22(2.6,0.751) 23(2.6,1.252) 24(2.6,1.753)
  rect 0.28x1 smd: 9(-1.753,-2.6) 10(-1.252,-2.6) 11(-0.751,-2.6) 12(-0.25,-2.6) 13(0.25,-2.6) 14(0.751,-2.6) 15(1.252,-2.6) 16(1.753,-2.6) 25(1.753,2.6) 26(1.252,2.6) 27(0.751,2.6) 28(0.25,2.6) 29(-0.25,2.6) 30(-0.751,2.6) 31(-1.252,2.6) 32(-1.753,2.6)
  rect 2.8x2.8 / inner rect 0x0 / far side rect 0x0 hole 0.3: 33(0,0)
via -1,0 diameter 0.32 hole 0.3
via -1,-1 diameter 0.32 hole 0.3
via 0,-1 diameter 0.32 hole 0.3
via 1,-1 diameter 0.32 hole 0.3
via 1,0.006 diameter 0.32 hole 0.3
via 1,1 diameter 0.32 hole 0.3
via 0,1 diameter 0.32 hole 0.3
via -1,1 diameter 0.32 hole 0.3
Top Overlay:
  circle w0.254: c-2.947,2.273 r0.04
  region: -3.683,2.032 -3.683,1.524 -3.175,1.778
  lines w0.127: -2.54,2.046 -2.54,2.515 -2.057,2.515 ; -2.489,-2.007 -2.489,-2.489 -2.051,-2.489 ; 2.007,-2.489 2.489,-2.489 2.489,-2.007 ; 2.007,2.489 2.489,2.489 2.489,2.007
Mechanical 8:
  rectangle: -1.883,2.087 -1.629,2.543
  rectangle: -1.382,2.087 -1.128,2.543
  rectangle: -0.881,2.087 -0.627,2.543
  rectangle: -0.38,2.087 -0.126,2.543
  rectangle: 0.121,2.087 0.375,2.543
  rectangle: 0.623,2.087 0.877,2.543
  rectangle: 1.123,2.087 1.377,2.543
  rectangle: 1.625,2.087 1.879,2.543
  region: -2.077,1.632 -2.077,1.886 -2.533,1.886 -2.533,1.632
  region: -2.078,1.131 -2.078,1.385 -2.534,1.385 -2.534,1.131
  region: -2.077,0.63 -2.077,0.884 -2.533,0.884 -2.533,0.63
  region: -2.078,0.129 -2.078,0.383 -2.534,0.383 -2.534,0.129
  region: -2.077,-0.373 -2.077,-0.119 -2.533,-0.119 -2.533,-0.373
  region: -2.078,-0.873 -2.078,-0.619 -2.534,-0.619 -2.534,-0.873
  region: -2.077,-1.375 -2.077,-1.121 -2.533,-1.121 -2.533,-1.375
  region: -2.078,-1.876 -2.078,-1.622 -2.534,-1.622 -2.534,-1.876
  region: 2.1,-1.628 2.1,-1.882 2.556,-1.882 2.556,-1.628
  region: 2.099,-1.127 2.099,-1.381 2.555,-1.381 2.555,-1.127
  region: 2.1,-0.626 2.1,-0.88 2.556,-0.88 2.556,-0.626
  region: 2.099,-0.125 2.099,-0.379 2.555,-0.379 2.555,-0.125
  region: 2.1,0.376 2.1,0.122 2.556,0.122 2.556,0.376
  region: 2.099,0.878 2.099,0.624 2.555,0.624 2.555,0.878
  region: 2.1,1.378 2.1,1.124 2.556,1.124 2.556,1.378
  region: 2.099,1.88 2.099,1.626 2.555,1.626 2.555,1.88
  region: -1.627,-2.085 -1.881,-2.085 -1.881,-2.541 -1.627,-2.541
  region: -1.126,-2.085 -1.38,-2.085 -1.38,-2.541 -1.126,-2.541
  region: -0.624,-2.085 -0.878,-2.085 -0.878,-2.541 -0.624,-2.541
  region: -0.124,-2.085 -0.378,-2.085 -0.378,-2.541 -0.124,-2.541
  region: 0.378,-2.085 0.124,-2.085 0.124,-2.541 0.378,-2.541
  region: 0.878,-2.085 0.624,-2.085 0.624,-2.541 0.878,-2.541
  region: 1.38,-2.085 1.126,-2.085 1.126,-2.541 1.38,-2.541
  region: 1.881,-2.085 1.627,-2.085 1.627,-2.541 1.881,-2.541
  lines w0.127: -2.489,-2.489 -2.489,2.515 2.489,2.515 2.489,-2.489 -1.905,-2.489
3D body "QFN32.STEP": height 0.8, standoff 0, extent -2.511,-2.487 2.489,2.513

## QFN35P700X700X80-69N [mm]
height 0.8
pads (69):
  rrect25% 0.84x0.17 smd mask+0.05: 1(-3.435,2.8) 2(-3.435,2.45) 3(-3.435,2.1) 4(-3.435,1.75) 5(-3.435,1.4) 6(-3.435,1.05) 7(-3.435,0.7) 8(-3.435,0.35) 9(-3.435,0) 10(-3.435,-0.35) 11(-3.435,-0.7) 12(-3.435,-1.05) 13(-3.435,-1.4) 14(-3.435,-1.75) 15(-3.435,-2.1) 16(-3.435,-2.45) 17(-3.435,-2.8) 35(3.435,-2.8) 36(3.435,-2.45) 37(3.435,-2.1) 38(3.435,-1.75) 39(3.435,-1.4) 40(3.435,-1.05) 41(3.435,-0.7) 42(3.435,-0.35) 43(3.435,0) 44(3.435,0.35) 45(3.435,0.7) 46(3.435,1.05) 47(3.435,1.4) 48(3.435,1.75) 49(3.435,2.1) 50(3.435,2.45) 51(3.435,2.8)
  rrect25% 0.17x0.84 smd mask+0.05: 18(-2.8,-3.435) 19(-2.45,-3.435) 20(-2.1,-3.435) 21(-1.75,-3.435) 22(-1.4,-3.435) 23(-1.05,-3.435) 24(-0.7,-3.435) 25(-0.35,-3.435) 26(0,-3.435) 27(0.35,-3.435) 28(0.7,-3.435) 29(1.05,-3.435) 30(1.4,-3.435) 31(1.75,-3.435) 32(2.1,-3.435) 33(2.45,-3.435) 34(2.8,-3.435) 52(2.8,3.435) 53(2.45,3.435) 54(2.1,3.435) 55(1.75,3.435) 56(1.4,3.435) 57(1.05,3.435) 58(0.7,3.435) 59(0.35,3.435) 60(0,3.435) 61(-0.35,3.435) 62(-0.7,3.435) 63(-1.05,3.435) 64(-1.4,3.435) 65(-1.75,3.435) 66(-2.1,3.435) 67(-2.45,3.435) 68(-2.8,3.435)
  rect 5.49x5.49 smd paste-4 mask+0.05: 69(0,0)
Top Overlay:
  circle w0.2: c-4.5,2.8 r0.1
  lines w0.127: -3.5,-3.205 -3.5,-3.5 -3.205,-3.5 ; -3.5,3.205 -3.5,3.5 -3.205,3.5 ; 3.205,-3.5 3.5,-3.5 3.5,-3.205 ; 3.205,3.5 3.5,3.5 3.5,3.205
Top Paste:
  region: -0.505,0.505 -2.245,0.505 -2.245,2.245 -0.505,2.245
  region: 2.245,0.505 0.505,0.505 0.505,2.245 2.245,2.245
  region: -0.505,-2.245 -2.245,-2.245 -2.245,-0.505 -0.505,-0.505
  region: 2.245,-2.245 0.505,-2.245 0.505,-0.505 2.245,-0.505
Mechanical 13:
  circle w0.2: c-4.5,2.8 r0.1
  lines w0.127: -3.5,-3.5 -3.5,3.5 3.5,3.5 3.5,-3.5 -3.5,-3.5
Mechanical 15:
  lines w0.05: -4.105,-4.105 -4.105,4.105 4.105,4.105 4.105,-4.105 -4.105,-4.105